# Altium footprint library motionboard.PcbLib: 89 footprints (part 2 of 6)
Each footprint in its own frame and in the unit in brackets; x right, y up, seen from the top. Pads: shape width x height; smd on the part's side, far side on the other; paste and mask are expansions set on the pad; w line width, h text height; cw(c..) or ccw(c..) is an arc to the next point about the centre after c.
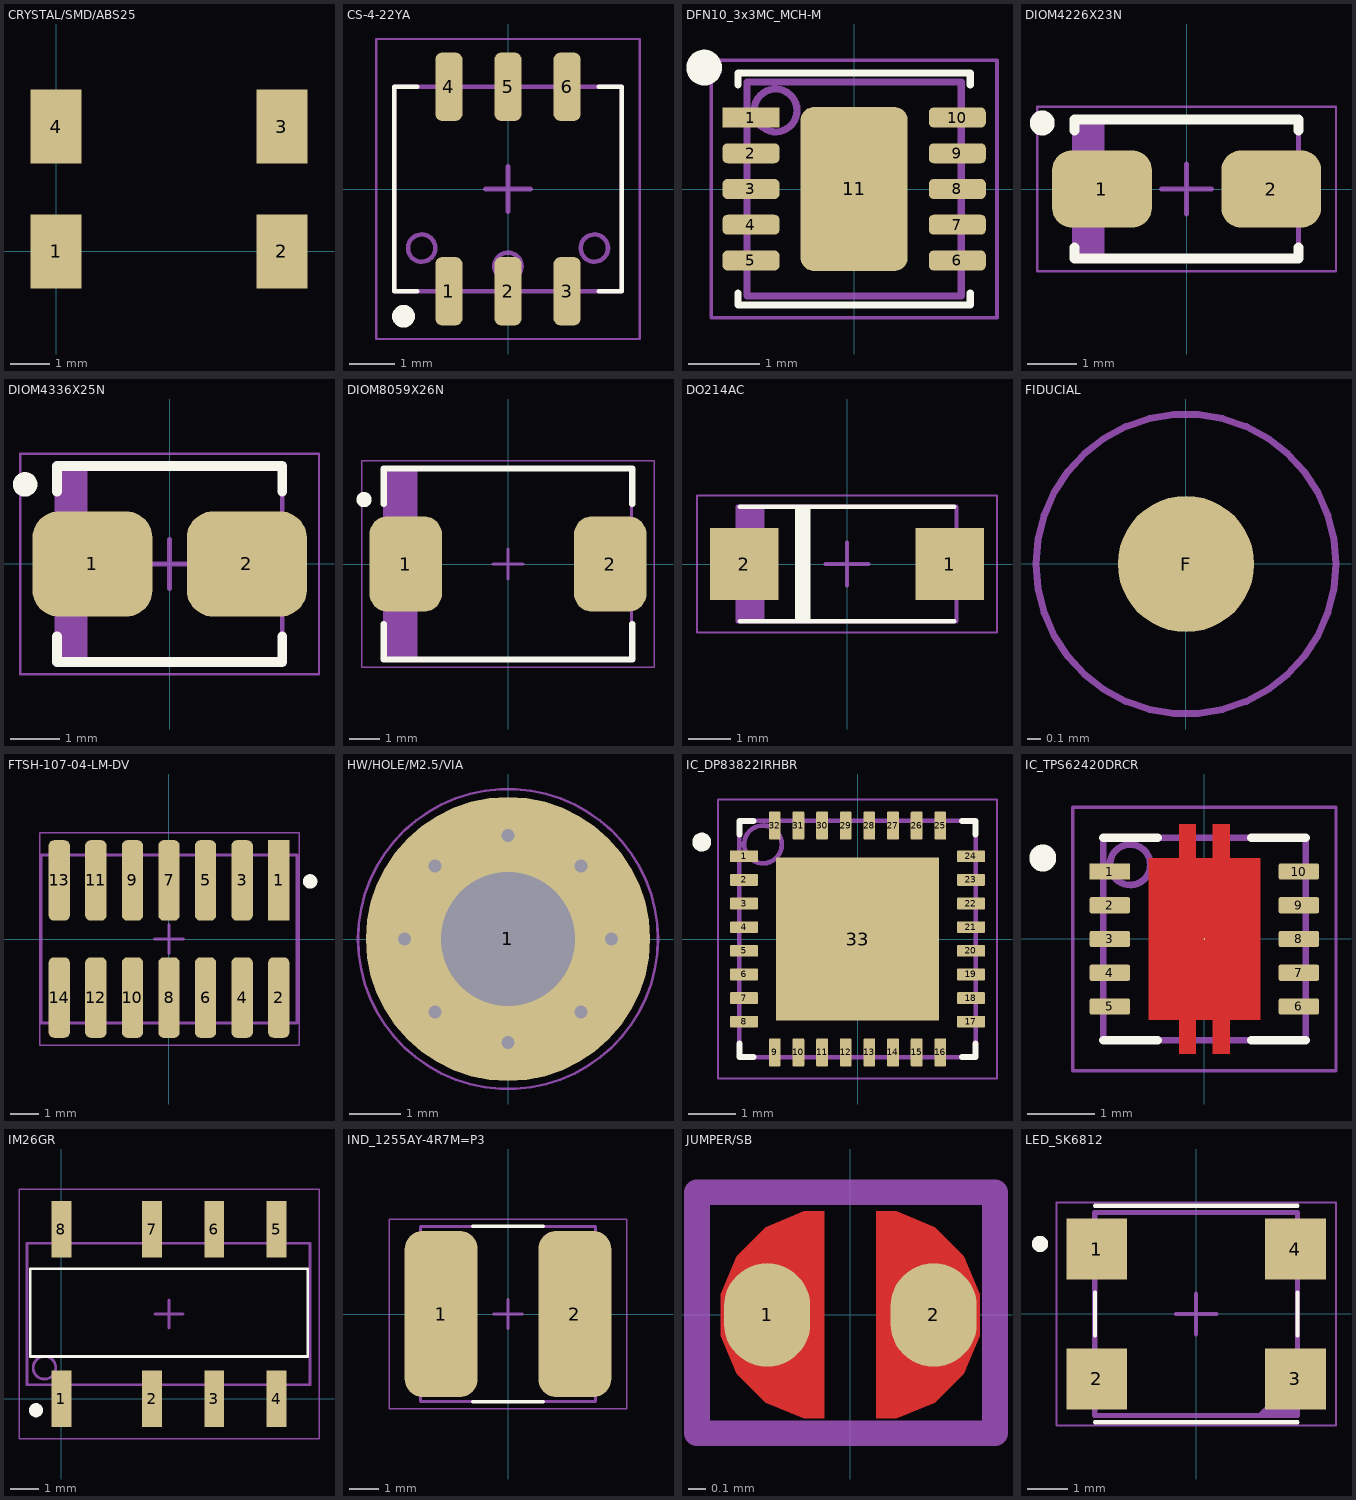
[diagram p1: the footprints below, top view; thin cyan lines are the x and y axes]

## CRYSTAL/SMD/ABS25 [mm]
pads (4):
  rect 1.3x1.9 smd: 1(0,0) 2(5.8,0) 3(5.8,3.2) 4(0,3.2)
Top Designator:
  text ".Designator" at 0.154,1.328 h1.2
3D body "ZM206.STEP": height 2.43, standoff -0.1, extent -1.141,-0.362 6.859,3.438

## CS-4-22YA [mm] "CS-4-22 series, SMD 6 J-Lead, Body 5.00x4.5mm, Manufacturer Guidelines"
height 2.3
pads (6):
  rrect50% 0.6x1.5 smd: 1(-1.3,-2.25) 2(0,-2.25) 3(1.3,-2.25) 4(-1.3,2.25) 5(0,2.25) 6(1.3,2.25)
Top Overlay:
  circle w0.3: c-2.3,-2.8 r0.1
  lines w0.1: -1.996,-2.25 -2.5,-2.25 -2.5,2.25 -1.996,2.25 ; 1.996,-2.25 2.5,-2.25 2.5,2.25 1.996,2.25
Top Assembly:
  circle w0.1: c-1.9,-1.3 r0.3
  circle w0.1: c1.9,-1.3 r0.3
  circle w0.1: c0,-1.7 r0.3
  lines w0.1: -2.5,-2.25 -2.5,2.25 2.5,2.25 2.5,-2.25 -2.5,-2.25
Top Courtyard:
  lines w0.05: -2.9,-3.3 -2.9,3.3 2.9,3.3 2.9,-3.3 -2.9,-3.3
  lines w0.1: -0.5,0 0.5,0 ; 0,-0.5 0,0.5
Top Designator:
  text ".Designator" at -2.705,-0.272 h1.2
3D body: height 2.4, standoff 2.2, extent -0.2,-1.5 0.2,1.5
3D body: height 2.35, standoff 0.15, extent -1.5,-1.5 1.5,1.5
3D body: height 2.3, standoff 2.2, extent -2.5,-2.25 2.5,2.25
3D body: height 2.2, standoff 0, extent -2.5,-2.25 2.5,2.25
3D body: height 2.35, standoff 0.15, extent -0.2,-2.1 0.2,-1.7
3D body: height 2.35, standoff 0.15, extent 1.7,-1.5 2.1,-1.1
3D body: height 2.35, standoff 0.15, extent -2.1,-1.5 -1.7,-1.1

## DFN10_3x3MC_MCH-M [mm]
pads (11):
  rect 0.8x0.28 smd: 1(-1.445,1)
  rrect50% 0.8x0.28 smd: 2(-1.445,0.5) 3(-1.445,0) 4(-1.445,-0.5) 5(-1.445,-1) 6(1.445,-1) 7(1.445,-0.5) 8(1.445,0) 9(1.445,0.5) 10(1.445,1)
  rrect25% 1.5x2.3 smd: 11(0,0)
Top Overlay:
  circle w0.3: c-2.1,1.7 r0.1
  lines w0.1: -1.626,-1.46 -1.626,-1.626 1.626,-1.626 1.626,-1.46 ; -1.626,1.46 -1.626,1.626 1.626,1.626 1.626,1.46
Top Assembly:
  circle w0.1: c-1.1,1.1 r0.3
  lines w0.1: -1.499,-1.499 -1.499,1.499 1.499,1.499 1.499,-1.499 -1.499,-1.499
Top Courtyard:
  lines w0.05: -2,-1.8 2,-1.8 2,1.8 -2,1.8 -2,-1.8
  lines w0.1: -0.5,0 0.5,0 ; 0,-0.5 0,0.5
Top Designator:
  text ".Designator" at -2.867,-0.209 h1.2
3D body "DFN10_3x3MC_MCH.step": height -0.42, standoff -1.36, extent -1.499,-1.499 1.499,1.499

## DIOM4226X23N [mm] "Molded Diode, 2-Leads, Body 4.20x2.65mm, IPC Medium Density"
height 2.3
pads (2):
  rrect50% 2x1.55 smd: 1(-1.7,0) 2(1.7,0)
Top Overlay:
  circle w0.25: c-2.9,1.325 r0.125
  lines w0.2: -2.25,-1.175 -2.25,-1.4 2.25,-1.4 2.25,-1.175 ; -2.25,1.175 -2.25,1.4 2.25,1.4 2.25,1.175
Top Assembly:
  rectangle: -2.25,-1.4 -1.645,1.4
  lines w0.1: -2.25,-1.4 -2.25,1.4 2.25,1.4 2.25,-1.4 -2.25,-1.4
Top Courtyard:
  lines w0.05: -3,-1.65 -3,1.65 3,1.65 3,-1.65 -3,-1.65
  lines w0.1: -0.5,0 0.5,0 ; 0,-0.5 0,0.5
Top Designator:
  text ".Designator" at -2.767,-0.272 h1.2
3D body "DIOM4226X23N.step": height 2.3, standoff 0, extent -2.47,-1.4 2.47,1.4

## DIOM4336X25N [mm] "Molded Diode, 2-Leads, Body 4.30x3.65mm, IPC Medium Density"
height 2.5
pads (2):
  rrect50% 2.45x2.15 smd: 1(-1.575,0) 2(1.575,0)
Top Overlay:
  circle w0.25: c-2.95,1.625 r0.125
  lines w0.2: -2.3,-1.475 -2.3,-2 2.3,-2 2.3,-1.475 ; -2.3,1.475 -2.3,2 2.3,2 2.3,1.475
Top Assembly:
  rectangle: -2.3,-2 -1.681,2
  lines w0.1: -2.3,-2 2.3,-2 2.3,2 -2.3,2 -2.3,-2
Top Courtyard:
  lines w0.05: -3.05,-2.25 3.05,-2.25 3.05,2.25 -3.05,2.25 -3.05,-2.25
  lines w0.1: -0.5,0 0.5,0 ; 0,-0.5 0,0.5
Top Designator:
  text ".Designator" at -2.767,-0.272 h1.2
3D body "DIOM4336X25N.step": height 2.5, standoff 0, extent -2.52,-2 2.52,2

## DIOM8059X26N [mm] "Molded Diode, 2-Leads, Body 7.95x5.93mm, IPC Medium Density"
height 2.6
pads (2):
  rrect50% 2.4x3.15 smd: 1(-3.375,0) 2(3.375,0)
Top Overlay:
  circle w0.25: c-4.75,2.125 r0.125
  lines w0.2: -4.1,-1.975 -4.1,-3.15 4.1,-3.15 4.1,-1.975 ; -4.1,1.975 -4.1,3.15 4.1,3.15 4.1,1.975
Top Assembly:
  rectangle: -4.075,-3.125 -2.979,3.125
  lines w0.1: -4.075,-3.125 4.075,-3.125 4.075,3.125 -4.075,3.125 -4.075,-3.125
Top Courtyard:
  lines w0.05: -4.825,-3.4 4.825,-3.4 4.825,3.4 -4.825,3.4 -4.825,-3.4
  lines w0.1: -0.5,0 0.5,0 ; 0,-0.5 0,0.5
Top Designator:
  text ".Designator" at -2.78,-0.272 h1.2
3D body "DIOM8059X26N.step": height 2.6, standoff 0, extent -4.295,-3.125 4.295,3.125

## DO214AC [mm]
pads (2):
  rect 1.6x1.67 smd: 1(2.4,0) 2(-2.4,0)
Top Overlay:
  rectangle: -1.217,-1.333 -0.85,1.334
  lines w0.1: -2.5,-1.334 2.5,-1.334 ; -2.5,1.334 2.5,1.334
Top Assembly:
  rectangle: -2.553,-1.333 -1.924,1.334
  lines w0.1: -2.553,-1.333 -2.553,1.334 2.553,1.334 2.553,-1.333 -2.553,-1.333
Top Courtyard:
  lines w0.05: -3.5,-1.6 3.5,-1.6 3.5,1.6 -3.5,1.6 -3.5,-1.6
  lines w0.1: -0.5,0 0.5,0 ; 0,-0.5 0,0.5
Top Designator:
  text ".Designator" at -2.705,-0.272 h1.2
3D body "DO214AC.STEP": height 2.17, standoff 0.03, extent -2.553,-1.333 2.553,1.334

## FIDUCIAL [mm] "Fiducial marker"
pads (1):
  round 1 smd paste-0.5 mask+0.5: F(0,0)
Top Courtyard:
  circle w0.05: c0,0 r1.1
Top Designator:
  text ".Designator" at -2.705,-0.272 h1.2

## FTSH-107-04-LM-DV [mm]
pads (14):
  rect 0.74x2.795 smd: 1(3.81,2.032)
  rrect50% 0.74x2.795 smd: 2(3.81,-2.032) 3(2.54,2.032) 4(2.54,-2.032) 5(1.27,2.032) 6(1.27,-2.032) 7(0,2.033) 8(0,-2.033) 9(-1.27,2.032) 10(-1.27,-2.032) 11(-2.54,2.032) 12(-2.54,-2.032) 13(-3.81,2.032) 14(-3.81,-2.032)
Top Overlay:
  circle w0.3: c4.9,2 r0.1
Top Assembly:
  lines w0.1: -4.445,-2.921 4.445,-2.921 4.445,2.921 -4.445,2.921 -4.445,-2.921
Top Courtyard:
  lines w0.05: -4.496,-3.68 -4.496,3.68 4.521,3.68 4.521,-3.68 -4.496,-3.68
  lines w0.1: -0.5,0 0.5,0 ; 0,-0.5 0,0.5
Top Designator:
  text ".Designator" at -2.39,-0.272 h1.2
3D body "FTSH-107-04-LM-DV--3DModel-STEP-56544.STEP": height 6.72, standoff -0.01, extent -4.445,-2.921 4.445,2.921

## HW/HOLE/M2.5/VIA [mm]
pads (1):
  round 5.5 hole 2.6: 1(0,0)
via -1.414,-1.414 diameter 0.6 hole 0.25
via 1.414,-1.414 diameter 0.6 hole 0.25
via 1.414,1.414 diameter 0.6 hole 0.25
via -1.414,1.414 diameter 0.6 hole 0.25
via -2,0 diameter 0.6 hole 0.25
via 0,-2 diameter 0.6 hole 0.25
via 2,0 diameter 0.6 hole 0.25
via 0,2 diameter 0.6 hole 0.25
Top Courtyard:
  circle w0.05: c0,0 r2.9
Top Designator:
  text ".Designator" at -2.705,-0.272 h1.2

## IC_DP83822IRHBR [mm]
pads (33):
  rect 0.6x0.25 smd: 1(-2.4,1.75)
  rrect25% 0.6x0.25 smd: 2(-2.4,1.25) 3(-2.4,0.75) 4(-2.4,0.25) 5(-2.4,-0.25) 6(-2.4,-0.75) 7(-2.4,-1.25) 8(-2.4,-1.75) 17(2.4,-1.75) 18(2.4,-1.25) 19(2.4,-0.75) 20(2.4,-0.25) 21(2.4,0.25) 22(2.4,0.75) 23(2.4,1.25) 24(2.4,1.75)
  rrect25% 0.25x0.6 smd: 9(-1.75,-2.4) 10(-1.25,-2.4) 11(-0.75,-2.4) 12(-0.25,-2.4) 13(0.25,-2.4) 14(0.75,-2.4) 15(1.25,-2.4) 16(1.75,-2.4) 25(1.75,2.4) 26(1.25,2.4) 27(0.75,2.4) 28(0.25,2.4) 29(-0.25,2.4) 30(-0.75,2.4) 31(-1.25,2.4) 32(-1.75,2.4)
  rect 3.45x3.45 smd paste-3: 33(0,0)
Top Overlay:
  circle w0.2: c-3.295,2.05 r0.1
  lines w0.127: -2.5,-2.205 -2.5,-2.5 -2.205,-2.5 ; -2.5,2.205 -2.5,2.5 -2.205,2.5 ; 2.205,-2.5 2.5,-2.5 2.5,-2.205 ; 2.205,2.5 2.5,2.5 2.5,2.205
Top Paste:
  region: 1.59,-1.59 0.1,-1.59 0.1,-0.1 1.59,-0.1
  region: -0.1,-1.59 -1.59,-1.59 -1.59,-0.1 -0.1,-0.1
  region: 1.59,0.1 0.1,0.1 0.1,1.59 1.59,1.59
  region: -0.1,0.1 -1.59,0.1 -1.59,1.59 -0.1,1.59
Top Assembly:
  circle w0.1: c-2,2 r0.4
  lines w0.1: -2.5,-2.5 -2.5,2.5 2.5,2.5 2.5,-2.5 -2.5,-2.5
Top Courtyard:
  lines w0.05: -2.95,-2.95 -2.95,2.95 2.95,2.95 2.95,-2.95 -2.95,-2.95
  lines w0.1: -0.5,0 0.5,0 ; 0,-0.5 0,0.5
Top Designator:
  text ".Designator" at -2.965,-0.272 h1.2
3D body "DP83822IRHBR--3DModel-STEP-56544.STEP": height 1, standoff 0, extent -2.5,-2.5 2.5,2.5

## IC_TPS62420DRCR [mm]
pads (11):
  rect 0.6x0.24 smd: 1(-1.4,1)
  rrect25% 0.6x0.24 smd: 2(-1.4,0.5) 3(-1.4,0) 4(-1.4,-0.5) 5(-1.4,-1) 6(1.4,-1) 7(1.4,-0.5) 8(1.4,0) 9(1.4,0.5) 10(1.4,1)
  round 0.025 smd paste-0.061: 11(0,0)
Top Layer:
  region: 0.375,1.2 0.825,1.2 0.825,-1.2 0.375,-1.2 0.375,-1.7 0.125,-1.7 0.125,-1.2 -0.125,-1.2 -0.125,-1.7 -0.375,-1.7 -0.375,-1.2 -0.825,-1.2 -0.825,1.2 -0.375,1.2 -0.375,1.7 -0.125,1.7 -0.125,1.2 0.125,1.2 0.125,1.7 0.375,1.7
Top Overlay:
  circle w0.2: c-2.395,1.2 r0.1
  lines w0.127: -1.5,-1.5 -0.695,-1.5 ; -1.5,1.5 -0.695,1.5 ; 0.695,-1.5 1.5,-1.5 ; 0.695,1.5 1.5,1.5
Top Assembly:
  circle w0.1: c-1.1,1.1 r0.3
  lines w0.1: -1.5,-1.5 1.5,-1.5 1.5,1.5 -1.5,1.5 -1.5,-1.5
Top Courtyard:
  lines w0.05: -1.95,-1.95 1.95,-1.95 1.95,1.95 -1.95,1.95 -1.95,-1.95
  lines w0.1: -0.5,0 0.5,0 ; 0,-0.5 0,0.5
Top Designator:
  text ".Designator" at -3.015,-0.272 h1.2
3D body "TPS62420DRCR.STEP": height 1, standoff 0, extent -1.5,-1.5 1.5,1.5

## IM26GR [mm]
pads (8):
  rect 0.7x2 smd: 1(0,0) 2(3.2,0) 3(5.4,0) 4(7.6,0) 5(7.6,6) 6(5.4,6) 7(3.2,6) 8(0,6)
Top Overlay:
  circle w0.3: c-0.9,-0.4 r0.1
  lines w0.1: -1.1,1.5 8.7,1.5 8.7,4.6 -1.1,4.6 -1.1,1.5
Top Assembly:
  circle w0.1: c-0.6,1.1 r0.4
  lines w0.1: -1.215,0.5 8.785,0.5 8.785,5.5 -1.215,5.5 -1.215,0.5
Top Courtyard:
  lines w0.05: -1.5,-1.4 -1.5,7.4 9.1,7.4 9.1,-1.4 -1.5,-1.4
  lines w0.1: 3.3,3 4.3,3 ; 3.8,2.5 3.8,3.5
Top Designator:
  text ".Designator" at 1.095,2.728 h1.2
3D body "IM26GR.STEP": height 5.66, standoff 0, extent -1.215,-0.761 8.785,6.755

## IND_1255AY-4R7M=P3 [mm]
pads (2):
  rrect50% 2.5x5.7 smd: 1(-2.286,0) 2(2.286,0)
Top Overlay:
  lines w0.127: -1.2,-3 1.2,-3 ; -1.2,3 1.2,3
Top Assembly:
  lines w0.1: -3,-3 3,-3 3,3 -3,3 -3,-3
Top Courtyard:
  lines w0.05: -4.064,-3.25 4.064,-3.25 4.064,3.25 -4.064,3.25 -4.064,-3.25
  lines w0.1: -0.5,0 0.5,0 ; 0,-0.5 0,0.5
Top Designator:
  text ".Designator" at -2.705,-0.272 h1.2
3D body "1255AY-4R7M=P3.STEP": height 4.5, standoff 0, extent -3,-3 3,3

## JUMPER/SB [mm]
pads (2):
  oval 0.5x0.6 smd paste-2 mask+0.07: 1(-0.483,0) 2(0.483,0)
Top Layer:
  region: 0.15,-0.6 0.269,-0.6 0.49,-0.509 0.659,-0.34 0.75,-0.119 0.75,0.119 0.659,0.34 0.49,0.509 0.269,0.6 0.15,0.6
  region: -0.15,0.6 -0.269,0.6 -0.49,0.509 -0.659,0.34 -0.75,0.119 -0.75,-0.119 -0.659,-0.34 -0.49,-0.509 -0.269,-0.6 -0.15,-0.6
Top Solder:
  region: -0.147,-0.7 0.156,-0.7 0.15,-0.7 0.242,-0.7 0.42,-0.652 0.58,-0.56 0.71,-0.43 0.802,-0.27 0.85,-0.092 0.85,0.092 0.802,0.27 0.71,0.43 0.58,0.56 0.42,0.652 0.242,0.7 0.15,0.7 0.158,0.699 -0.146,0.699 -0.15,0.7 -0.242,0.7 -0.42,0.652 -0.58,0.56 -0.71,0.43 -0.802,0.27 -0.85,0.092 -0.85,-0.092 -0.802,-0.27 -0.71,-0.43 -0.58,-0.56 -0.42,-0.652 -0.242,-0.7 -0.15,-0.7
Top Courtyard:
  lines w0.15: -0.889,0.711 -0.889,-0.686 0.838,-0.686 0.838,0.711 -0.864,0.711
Top Designator:
  text ".Designator" at -2.73,-0.259 h1.2

## LED_SK6812 [mm]
pads (4):
  rect 1.5x1.5 smd: 1(-2.45,1.6) 2(-2.45,-1.6) 3(2.45,-1.6) 4(2.45,1.6)
Top Overlay:
  circle w0.2: c-3.85,1.73 r0.1
  lines w0.1: -2.5,-2.67 2.5,-2.67 ; -2.5,-0.53 -2.5,0.53 ; -2.5,2.67 2.5,2.67 ; 2.5,-0.53 2.5,0.53
Top Assembly:
  circle w0.2: c-3.85,1.73 r0.1
  region: 2.5,-2.5 1.5,-2.5 2.5,-1.5
  lines w0.127: -2.5,-2.5 2.5,-2.5 2.5,2.5 -2.5,2.5 -2.5,-2.5
Top Courtyard:
  lines w0.05: -3.45,-2.75 3.45,-2.75 3.45,2.75 -3.45,2.75 -3.45,-2.75
  lines w0.1: -0.5,0 0.5,0 ; 0,-0.5 0,0.5
Top Designator:
  text ".Designator" at -2.992,-0.272 h1.2
3D body "step_temp.STEP": height 1.6, standoff 0, extent -2.7,-2.5 2.7,2.5